# Altium footprint library Connectors.PcbLib: 69 footprints (part 3 of 5)
Each footprint in its own frame and in the unit in brackets; x right, y up, seen from the top. Pads: shape width x height; smd on the part's side, far side on the other; paste and mask are expansions set on the pad; w line width, h text height; cw(c..) or ccw(c..) is an arc to the next point about the centre after c.
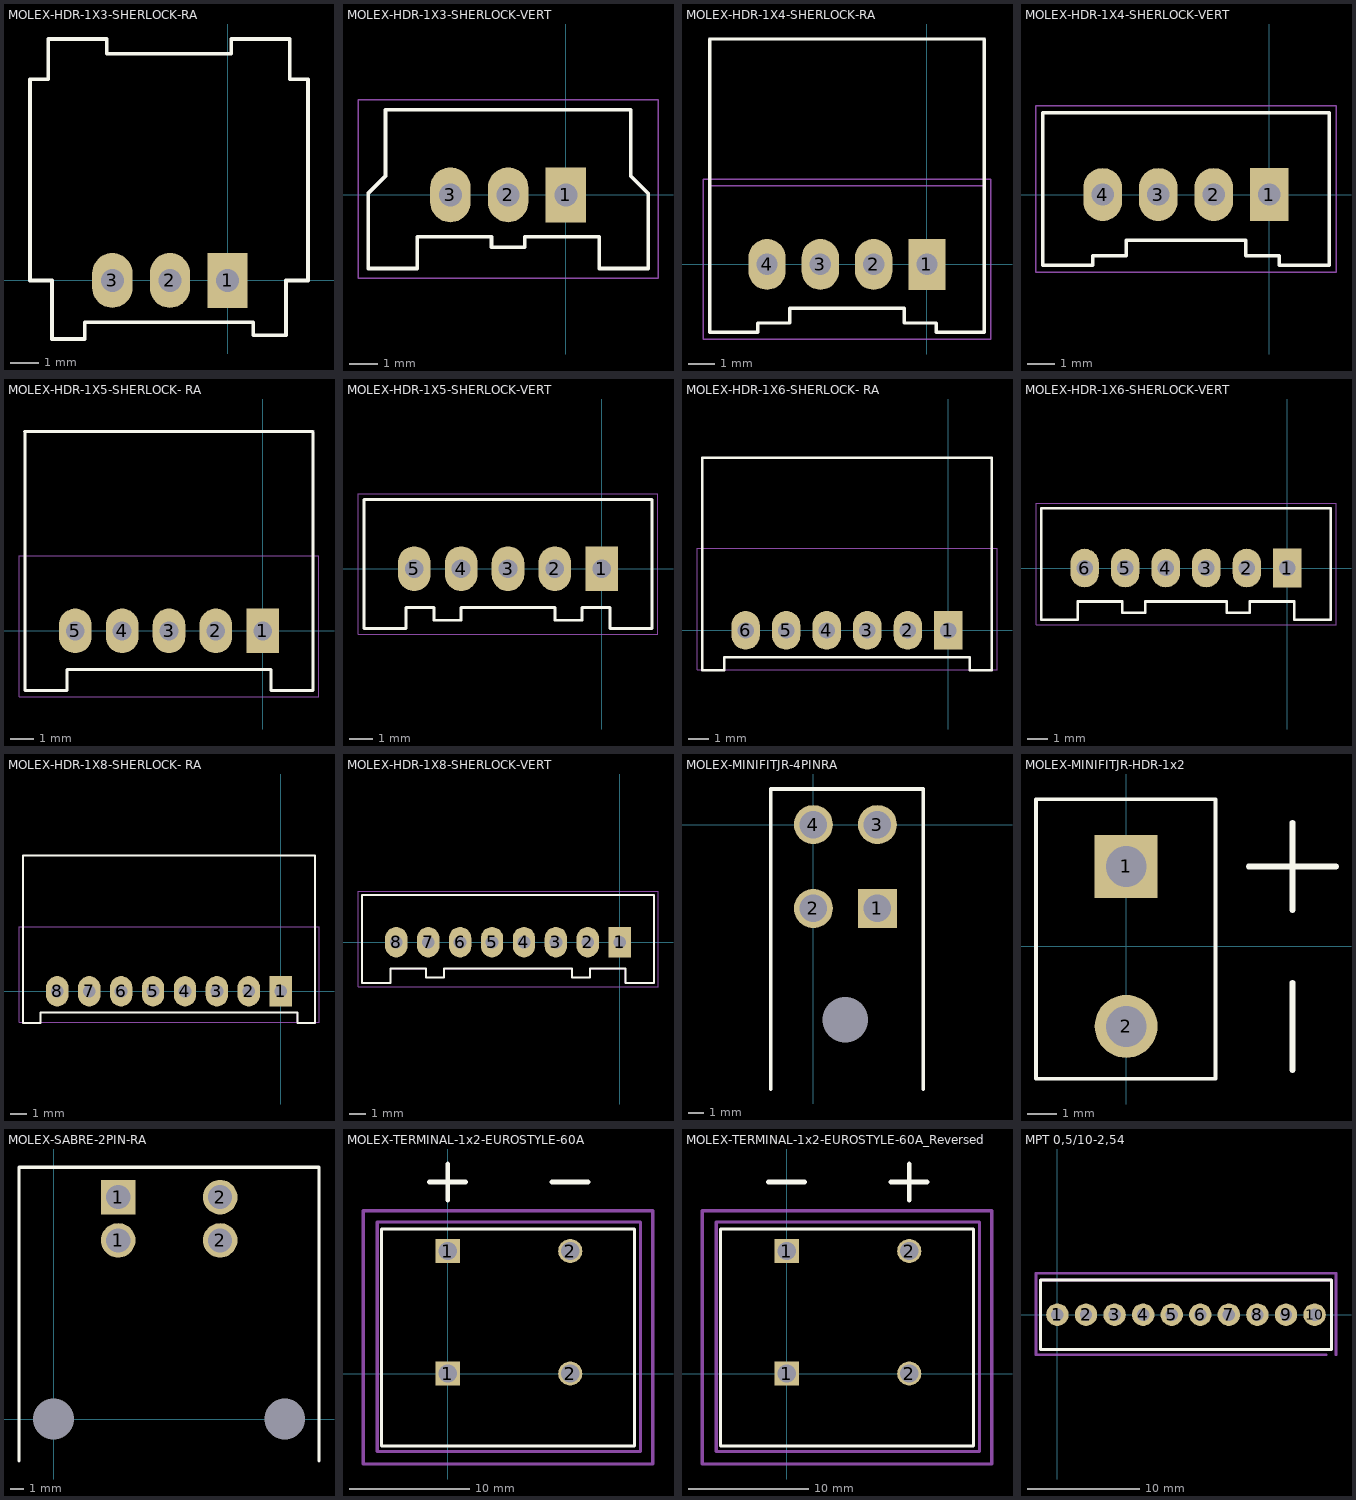
[diagram p2: the footprints below, top view; thin cyan lines are the x and y axes]

## MOLEX-HDR-1X3-SHERLOCK-RA [mm]
height 8.5
pads (3):
  rect 1.397x1.905 hole 0.8: 1(0,0)
  oval 1.397x1.905 hole 0.8: 2(-2,0) 3(-4,0)
Top Overlay:
  lines w0.127: -6.858,0 -6.096,0 -6.096,-2.032 -4.953,-2.032 -4.953,-1.45 -2.575,-1.45 -1.425,-1.45 0.889,-1.45 0.889,-1.905 2.032,-1.905 2.032,0 2.794,0 2.794,6.985 2.159,6.985 2.159,8.382 0.127,8.382 0.127,7.874 -4.191,7.874 -4.191,8.382 -6.223,8.382 -6.223,6.985 -6.858,6.985 -6.858,0
3D body "353630360.stp": height 5.75, standoff -2.95, extent -6.882,-1.991 2.818,8.509

## MOLEX-HDR-1X3-SHERLOCK-VERT [mm]
height 8.5
pads (3):
  rect 1.397x1.905 hole 0.8: 1(0,0)
  oval 1.397x1.905 hole 0.8: 2(-2,0) 3(-4,0)
Top Overlay:
  lines w0.127: -6.85,-2.55 -5.15,-2.55 -5.15,-1.45 -2.575,-1.45 -2.575,-1.82 -1.425,-1.82 -1.425,-1.45 1.15,-1.45 1.15,-2.55 2.85,-2.55 2.85,0.05 2.25,0.65 2.25,2.95 -6.25,2.95 -6.25,0.65 -6.85,0.05 -6.85,-2.55
Mechanical 13:
  lines w0.05: -6.85,-2.55 -6.85,0.05 -6.25,0.65 -6.25,2.95 2.25,2.95 2.25,0.65 2.85,0.05 2.85,-2.55 1.15,-2.55 1.15,-1.45 -1.425,-1.45 -1.425,-1.82 -2.575,-1.82 -2.575,-1.45 -5.15,-1.45 -5.15,-2.55 -6.85,-2.55
Mechanical 15:
  lines w0.05: -7.2,-2.89 3.19,-2.89 3.19,3.295 -7.2,3.295 -7.2,-2.89
3D body "353620350.stp": height 8.57, standoff -3.23, extent -6.882,-2.565 2.818,2.985

## MOLEX-HDR-1X4-SHERLOCK-RA [mm]
height 8.5
pads (4):
  rect 1.397x1.905 hole 0.8: 1(0,0)
  oval 1.397x1.905 hole 0.8: 2(-2,0) 3(-4,0) 4(-6,0)
Top Overlay:
  lines w0.127: -8.15,-2.55 -6.35,-2.55 -6.35,-2.2 -5.15,-2.2 -5.15,-1.65 -0.85,-1.65 -0.85,-2.2 0.35,-2.2 0.35,-2.55 2.15,-2.55 2.15,2.95 2.15,8.449 2.141,8.458 -8.147,8.458 -8.15,8.455 -8.15,2.95 -8.15,-2.55
Mechanical 13:
  lines w0.05: -8.15,-2.55 -8.15,2.95 2.15,2.95 2.15,-2.55 0.35,-2.55 0.35,-2.2 -0.85,-2.2 -0.85,-1.65 -5.15,-1.65 -5.15,-2.2 -6.35,-2.2 -6.35,-2.55 -8.15,-2.55
Mechanical 15:
  lines w0.05: -8.4,-2.8 -8.4,3.2 2.4,3.2 2.4,-2.8 -8.4,-2.8
3D body "353630460.stp": height 5.54, standoff -3.16, extent -8.173,-1.981 2.127,8.519

## MOLEX-HDR-1X4-SHERLOCK-VERT [mm]
height 8.5
pads (4):
  rect 1.397x1.905 hole 0.8: 1(0,0)
  oval 1.397x1.905 hole 0.8: 2(-2,0) 3(-4,0) 4(-6,0)
Top Overlay:
  lines w0.127: -8.15,-2.55 -6.35,-2.55 -6.35,-2.2 -5.15,-2.2 -5.15,-1.65 -0.85,-1.65 -0.85,-2.2 0.35,-2.2 0.35,-2.55 2.15,-2.55 2.15,2.95 -8.15,2.95 -8.15,-2.55
Mechanical 13:
  lines w0.05: -8.15,-2.55 -8.15,2.95 2.15,2.95 2.15,-2.55 0.35,-2.55 0.35,-2.2 -0.85,-2.2 -0.85,-1.65 -5.15,-1.65 -5.15,-2.2 -6.35,-2.2 -6.35,-2.55 -8.15,-2.55
Mechanical 15:
  lines w0.05: -8.4,-2.8 -8.4,3.2 2.4,3.2 2.4,-2.8 -8.4,-2.8
3D body "molex-sherlock-4v-353620450.stp": height 8.5, standoff -3.3, extent -8.128,-2.565 2.172,2.985

## MOLEX-HDR-1X5-SHERLOCK- RA [mm]
height 8.5
pads (5):
  rect 1.397x1.905 hole 0.8: 1(0,0)
  oval 1.397x1.905 hole 0.8: 2(-2,0) 3(-4,0) 4(-6,0) 5(-8,0)
Top Overlay:
  lines w0.127: -10.15,2.642 -10.15,8.499 -10.16,8.509 2.134,8.509 2.15,8.493 2.15,2.95 2.15,-2.55 0.35,-2.55 0.35,-1.65 ; -10.15,2.95 -10.15,-2.55 -8.35,-2.55 -8.35,-1.65 -7.15,-1.65 0.35,-1.65 ; -6,-1.65 -2,-1.65 ; -0.85,-1.65 0.35,-1.65
Mechanical 13:
  lines w0.05: -10.15,2.95 -10.15,-2.55 -8.35,-2.55 -8.35,-1.65 -7.15,-1.65 ; -6,-1.65 -2,-1.65 ; -0.85,-1.65 0.35,-1.65 0.35,-2.55 2.15,-2.55 2.15,2.95
Mechanical 15:
  lines w0.05: -10.4,-2.8 2.4,-2.8 2.4,3.2 -10.4,3.2 -10.4,-2.8
3D body "353630560.stp": height 5.54, standoff -3.16, extent -10.16,-1.956 2.14,8.544

## MOLEX-HDR-1X5-SHERLOCK-VERT [mm]
height 8.5
pads (5):
  rect 1.397x1.905 hole 0.8: 1(0,0)
  oval 1.397x1.905 hole 0.8: 2(-2,0) 3(-4,0) 4(-6,0) 5(-8,0)
Top Overlay:
  lines w0.127: -10.15,-2.55 -10.15,2.95 2.15,2.95 2.15,-2.55 0.35,-2.55 0.35,-1.65 -0.85,-1.65 -0.85,-2.2 -2,-2.2 -2,-1.65 -6,-1.65 -6,-2.2 -7.15,-2.2 -7.15,-1.65 -8.35,-1.65 -8.35,-2.55 -10.15,-2.55
Mechanical 13:
  lines w0.05: -10.15,-2.55 -8.35,-2.55 -8.35,-1.65 -7.15,-1.65 -7.15,-2.2 -6,-2.2 -6,-1.65 -2,-1.65 -2,-2.2 -0.85,-2.2 -0.85,-1.65 0.35,-1.65 0.35,-2.55 2.15,-2.55 2.15,2.95 -10.15,2.95 -10.15,-2.55
Mechanical 15:
  lines w0.05: -10.4,-2.8 2.4,-2.8 2.4,3.2 -10.4,3.2 -10.4,-2.8
3D body "molex-sherlock-5v-353620550.stp": height 8.5, standoff -3.3, extent -10.16,-2.565 2.14,2.985

## MOLEX-HDR-1X6-SHERLOCK- RA [mm]
height 8.5
pads (6):
  rect 1.397x1.905 hole 0.8: 1(0,0)
  oval 1.397x1.905 hole 0.8: 2(-2,0) 3(-4,0) 4(-6,0) 5(-8,0) 6(-10,0)
Top Overlay:
  lines w0.127: -12.15,2.642 -12.15,8.499 ; -12.15,2.95 -12.15,-1.975 -11.05,-1.975 -11.05,-1.325 1.05,-1.325 1.05,-1.975 2.15,-1.975 2.15,2.95 2.15,8.493 2.134,8.509 -12.15,8.509
Mechanical 13:
  lines w0.05: -12.15,8.525 -12.15,-1.975 -11.05,-1.975 -11.05,-1.325 -2,-1.325 1.05,-1.325 1.05,-1.975 2.15,-1.975 2.15,8.525
  lines w0.051: -12.15,8.525 2.15,8.525
Mechanical 15:
  lines w0.05: -12.4,-1.95 2.4,-1.95 2.4,4.05 -12.4,4.05 -12.4,-1.95
3D body "353630660.stp": height 5.54, standoff -3.16, extent -12.15,-1.95 2.15,8.55

## MOLEX-HDR-1X6-SHERLOCK-VERT [mm]
height 8.5
pads (6):
  rect 1.397x1.905 hole 0.8: 1(0,0)
  oval 1.397x1.905 hole 0.8: 2(-2,0) 3(-4,0) 4(-6,0) 5(-8,0) 6(-10,0)
Top Overlay:
  lines w0.127: -12.15,-2.55 -12.15,2.95 2.15,2.95 2.15,-2.55 0.35,-2.55 0.35,-1.65 -1.85,-1.65 -1.85,-2.2 -3,-2.2 -3,-1.65 -7,-1.65 -7,-2.2 -8.15,-2.2 -8.15,-1.65 -10.35,-1.65 -10.35,-2.55 -12.15,-2.55
Mechanical 13:
  lines w0.05: -12.15,-2.55 -12.15,2.95 2.15,2.95 2.15,-2.55 0.35,-2.55 0.35,-1.65 -1.85,-1.65 -1.85,-2.2 -3,-2.2 -3,-1.65 -7,-1.65 -7,-2.2 -8.15,-2.2 -8.15,-1.65 -10.35,-1.65 -10.35,-2.55 -12.15,-2.55
Mechanical 15:
  lines w0.05: -12.4,-2.8 -12.4,3.2 2.4,3.2 2.4,-2.8 -12.4,-2.8
3D body "molex-sherlock-6v-353620650.stp": height 8.5, standoff -3.3, extent -12.166,-2.616 2.134,2.934

## MOLEX-HDR-1X8-SHERLOCK- RA [mm] "8 Positions Header Connector 0.079\" (2.00mm) Through Hole, Right Angle Tin"
height 5.55
pads (8):
  rect 1.397x1.905 hole 0.8: 1(0,0)
  oval 1.397x1.905 hole 0.8: 2(-2,0) 3(-4,0) 4(-6,0) 5(-8,0) 6(-10,0) 7(-12,0) 8(-14,0)
Top Overlay:
  lines w0.127: -16.15,2.642 -16.15,8.499 ; -16.15,2.95 -16.15,-1.975 -15.05,-1.975 -15.05,-1.325 1.05,-1.325 1.05,-1.975 2.15,-1.975 2.15,2.95 2.15,8.493 2.134,8.509 -16.15,8.509
Mechanical 13:
  lines w0.05: -16.15,8.525 -16.15,-1.975 -15.05,-1.975 -15.05,-1.325 -2,-1.325 1.05,-1.325 1.05,-1.975 2.15,-1.975 2.15,8.525
  lines w0.051: -16.15,8.525 2.15,8.525
Mechanical 15:
  lines w0.05: -16.4,-1.95 2.4,-1.95 2.4,4.05 -16.4,4.05 -16.4,-1.95
3D body "353630860.stp": height 5.5, standoff -3.2, extent -16.16,-1.956 2.14,8.544

## MOLEX-HDR-1X8-SHERLOCK-VERT [mm] "8 Positions Header Connector 0.079\" (2.00mm) Through Hole Tin"
height 8.5
pads (8):
  rect 1.397x1.905 hole 0.8: 1(0,0)
  oval 1.397x1.905 hole 0.8: 2(-2,0) 3(-4,0) 4(-6,0) 5(-8,0) 6(-10,0) 7(-12,0) 8(-14,0)
Top Overlay:
  lines w0.127: -16.15,-2.55 -14.35,-2.55 -14.35,-1.65 -12.15,-1.65 -12.15,-2.2 -11,-2.2 -11,-1.65 -3,-1.65 -3,-2.2 -1.85,-2.2 -1.85,-1.65 0.35,-1.65 0.35,-2.55 2.15,-2.55 2.15,2.95 -16.15,2.95 -16.15,-2.55
Mechanical 13:
  lines w0.05: -16.15,-2.55 -14.35,-2.55 -14.35,-1.65 -12.15,-1.65 -12.15,-2.2 -11,-2.2 -11,-1.65 -3,-1.65 -3,-2.2 -1.85,-2.2 -1.85,-1.65 0.35,-1.65 0.35,-2.55 2.15,-2.55 2.15,2.95 -16.15,2.95 -16.15,-2.55
Mechanical 15:
  lines w0.05: -16.4,-2.8 2.4,-2.8 2.4,3.2 -16.4,3.2 -16.4,-2.8
3D body "353620850.stp": height 9.25, standoff -2.55, extent -16.141,-2.565 2.159,2.985

## MOLEX-MINIFITJR-4PINRA [mm] "4 position, right angle, connector"
pads (5):
  rect 2.562x2.562 hole 1.8: 1(4.2,-5.5)
  round 2.562 hole 1.8: 2(0,-5.5) 3(4.2,0) 4(0,0)
  round 0 hole 3: ""(2.1,-12.8)
Top Overlay:
  lines w0.254: -2.8,-17.348 -2.8,2.337 7.214,2.337 7.214,-17.348
3D body "039301040.stp": height 11.4, standoff -3.6, extent -2.685,-19.391 7.315,0.544

## MOLEX-MINIFITJR-HDR-1x2 [mm] "MINIFITJRHDR VT DR O/PGS 2POS"
height 12.8
pads (2):
  rect 2.162x2.162 hole 1.4: 1(0,2.75)
  round 2.162 hole 1.4: 2(0,-2.75)
Top Overlay:
  lines w0.127: -3.099,-4.545 -3.099,5.055 3.073,5.055 3.073,-4.545 -3.099,-4.545
  lines w0.2: 4.215,2.75 7.215,2.75 ; 5.715,-4.25 5.715,-1.25 ; 5.715,1.25 5.715,4.25
3D body "039310020.stp": height 12.8, standoff -3.5, extent -3.101,-5.957 3.099,5.043

## MOLEX-SABRE-2PIN-RA [mm] "2 position, right angle, connector"
pads (6):
  round 2.542 hole 1.78: 1(4.75,13.13) 2(12.24,13.13) 2(12.24,16.31)
  rect 2.542x2.542 hole 1.78: 1(4.75,16.31)
  round 0 hole 3: ""(0,0) ""(16.99,0)
Top Overlay:
  lines w0.254: -2.54,-3.048 -2.54,18.491 19.507,18.491 19.507,-3.048
3D body "431601102.stp": height 13.37, standoff -3.83, extent -2.057,-3.035 19.025,16.751

## MOLEX-TERMINAL-1x2-EUROSTYLE-60A [mm]
height 29.7
pads (4):
  rect 2x2 hole 1.52: 1(0,0) 1(0,10.16)
  round 2 hole 1.52: 2(10.16,0) 2(10.16,10.16)
Top Overlay:
  lines w0.254: -5.5,-6 -5.5,12 15.5,12 15.5,-6 -5.5,-6
  lines w0.4: -1.5,15.875 1.5,15.875 ; 0,14.375 0,17.375 ; 8.66,15.875 11.66,15.875
Mechanical 13:
  lines w0.254: -5.84,-6.45 16,-6.45 16,12.55 -5.84,12.55 -5.84,-6.45
Mechanical 15:
  lines w0.254: -7,-7.5 -7,13.5 17,13.5 17,-7.5 -7,-7.5
3D body "399700102.stp": height 29.72, standoff -3.68, extent -5.947,-6.443 15.897,12.353

## MOLEX-TERMINAL-1x2-EUROSTYLE-60A_Reversed [mm]
height 29.7
pads (4):
  rect 2x2 hole 1.52: 1(0,0) 1(0,10.16)
  round 2 hole 1.52: 2(10.16,0) 2(10.16,10.16)
Top Overlay:
  lines w0.254: -5.5,-6 -5.5,12 15.5,12 15.5,-6 -5.5,-6
  lines w0.4: -1.5,15.875 1.5,15.875 ; 8.66,15.875 11.66,15.875 ; 10.16,14.375 10.16,17.375
Mechanical 13:
  lines w0.254: -5.84,-6.45 16,-6.45 16,12.55 -5.84,12.55 -5.84,-6.45
Mechanical 15:
  lines w0.254: -7,-7.5 -7,13.5 17,13.5 17,-7.5 -7,-7.5
3D body "399700102.stp": height 29.72, standoff -3.68, extent -5.947,-6.443 15.897,12.353

## MPT 0,5/10-2,54 [mm] "CONN TERM BLOCK 2.54MM 10POS"
height 8.5
pads (10):
  round 2 hole 1.1: 1(0,0) 2(2.54,0) 3(5.08,0) 4(7.62,0) 5(10.16,0) 6(12.7,0) 7(15.24,0) 8(17.78,0) 9(20.32,0) 10(22.86,0)
Top Overlay:
  lines w0.254: 24.205,-3.1 24.36,-2.945 ; -1.5,-3.1 -1.5,3.1 24.36,3.1 24.36,-3.1 -1.5,-3.1
Mechanical 13:
  lines w0.254: -1.5,-3.1 24.36,-3.1 24.36,3.1 -1.5,3.1 -1.5,-3.1
Mechanical 15:
  lines w0.254: 23.876,-3.556 -1.905,-3.556 -1.905,3.683 24.765,3.683 24.765,-3.556